# Altium footprint library csy.PcbLib: 198 footprints (part 9 of 13)
Each footprint in its own frame and in the unit in brackets; x right, y up, seen from the top. Pads: shape width x height; smd on the part's side, far side on the other; paste and mask are expansions set on the pad; w line width, h text height; cw(c..) or ccw(c..) is an arc to the next point about the centre after c.
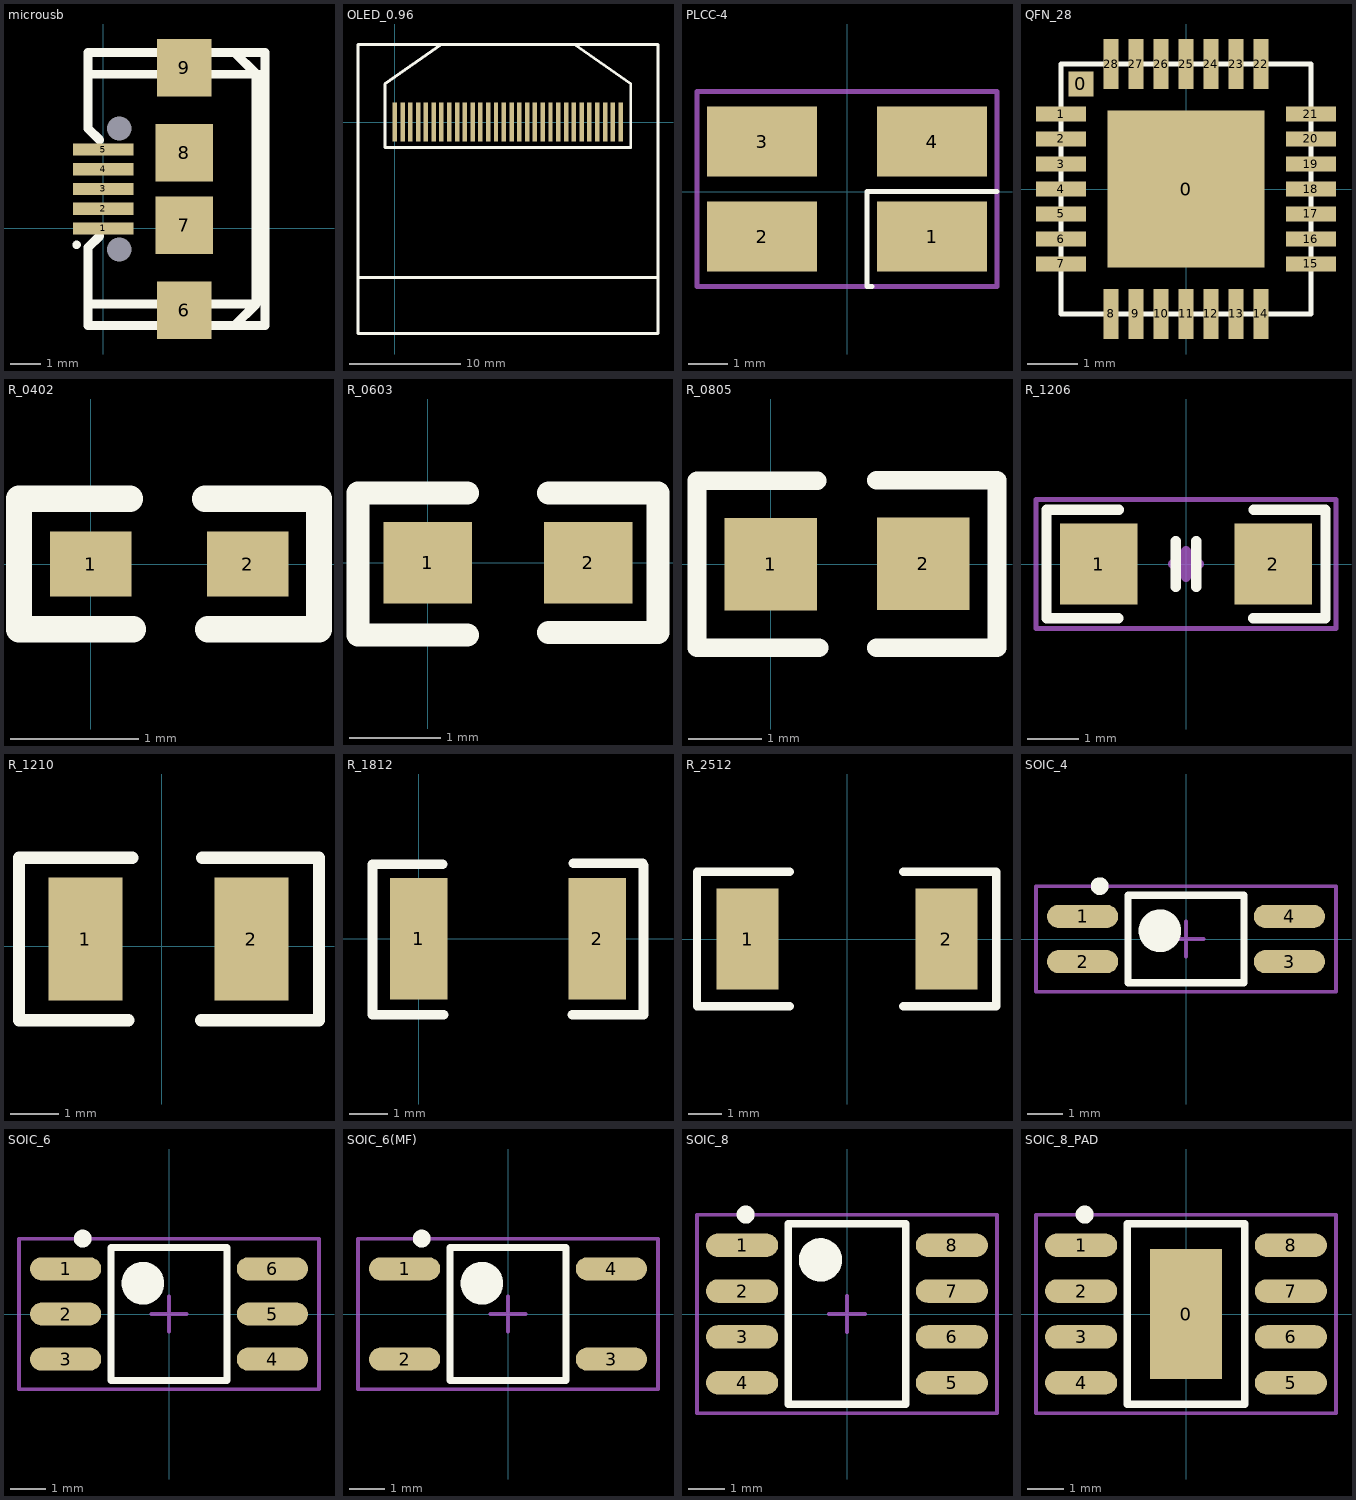
[diagram p8: the footprints below, top view; thin cyan lines are the x and y axes]

## microusb [mm] "Connector; USB1.1, Type B, SM; 4 Position; Right Angle"
height 11
pads (11):
  rect 2x0.4 smd mask+0.001: 1(0,0) 2(0,0.65) 3(0,1.3) 4(0,1.95) 5(0,2.6)
  rect 1.8x1.9 smd: 6(2.675,-2.7) 9(2.675,5.3)
  rect 1.9x1.9 smd: 7(2.675,0.1) 8(2.675,2.5)
  round 0 hole 0.8 unplated mask+0.001: MH1(0.525,3.3) MH2(0.525,-0.7)
Top Overlay:
  circle w0.25: c-0.881,-0.542 r0.011
  lines w0.3: -0.452,-2.495 5.04,-2.495 ; -0.452,5.094 5.334,5.08 5.04,5.094 ; -0.127,-0.254 -0.5,-0.627 -0.5,-3.209 4.326,-3.209 5.04,-2.495 ; -0.127,2.921 -0.5,3.294 -0.5,5.808 4.326,5.808 5.04,5.094 ; 3.818,5.808 5.334,5.808 5.334,-3.209 3.945,-3.209 ; 5.04,-2.495 5.04,5.094
3D body "AP2014.STEP": height 2.79, standoff -0.28, extent -0.11,-3.091 5.515,5.709

## OLED_0.96 [mm] "128*64"
height 0.051
pads (30):
  rect 0.4x3.5 smd: 1(0,0) 2(0.7,0) 3(1.4,0) 4(2.1,0) 5(2.8,0) 6(3.5,0) 7(4.2,0) 8(4.9,0) 9(5.6,0) 10(6.3,0) 11(7,0) 12(7.7,0) 13(8.4,0) 14(9.1,0) 15(9.8,0) 16(10.5,0) 17(11.2,0) 18(11.9,0) 19(12.6,0) 20(13.3,0) 21(14,0) 22(14.7,0) 23(15.4,0) 24(16.1,0) 25(16.8,0) 26(17.5,0) 27(18.2,0) 28(18.9,0) 29(19.6,0) 30(20.3,0)
Top Overlay:
  lines w0.254: -3.302,-13.97 4.572,-13.97 ; 4.191,6.985 -0.889,3.429 -0.889,-2.286 21.209,-2.286 21.209,3.429 16.129,6.985 ; 4.318,-13.97 23.533,-13.97 ; -3.302,-19.015 23.66,-19.015 23.66,6.985 -3.302,6.985 -3.302,-19.015

## PLCC-4 [mil]
pads (4):
  rect 110x70 smd: 1(85,-45) 2(-85,-45) 3(-85,50) 4(85,50)
Top Overlay:
  lines w5: 25,-95 20,-95 20,0 150,0
Mechanical 4:
  lines w5: -150,-95 25,-95 ; -150,-95 -150,100 ; -150,-95 25,-95 ; -150,-95 -150,100 ; -150,100 150,100 ; -150,100 150,100 ; 25,-95 150,-95 ; 25,-95 150,-95 ; 150,-95 150,0 ; 150,-95 150,0 ; 150,0 150,100 ; 150,0 150,100

## QFN_28 [mm] "CP2102_GMR"
pads (30):
  rect 0.5x0.5 smd: 0(-2.1,2.1)
  rect 3.15x3.15 smd: 0(0,0)
  rect 1x0.3 smd: 1(-2.5,1.5) 2(-2.5,1) 3(-2.5,0.5) 4(-2.5,0) 5(-2.5,-0.5) 6(-2.5,-1) 7(-2.5,-1.5) 15(2.5,-1.5) 16(2.5,-1) 17(2.5,-0.5) 18(2.5,0) 19(2.5,0.5) 20(2.5,1) 21(2.5,1.5)
  rect 0.3x1 smd: 8(-1.5,-2.5) 9(-1,-2.5) 10(-0.5,-2.5) 11(0,-2.5) 12(0.5,-2.5) 13(1,-2.5) 14(1.5,-2.5) 22(1.5,2.5) 23(1,2.5) 24(0.5,2.5) 25(0,2.5) 26(-0.5,2.5) 27(-1,2.5) 28(-1.5,2.5)
Top Overlay:
  lines w0.1: -2.5,-2.5 -2.5,2.5 2.5,2.5 2.5,-2.5 -2.5,-2.5
3D body "CP2102-GMR.STEP": height 0.92, standoff 0, extent -2.5,-2.5 2.5,2.5

## R_0402 [mil] "1/16W"
pads (2):
  rect 25x20 smd: 1(0,0) 2(48.2,0)
Top Overlay:
  lines w8: 12,20 -22,20 -22,-20 13,-20 ; 35,20 70,20 70,-20 36,-20
3D body "R0402.STEP": height 13.78, standoff 0, extent 4.71,-9.79 44.09,9.9

## R_0603 [mil] "1608"
pads (2):
  rect 38x35 smd: 1(0,0) 2(69,0)
Top Overlay:
  lines w10: 17,-31 -30,-31 -30,30 17,30 ; 52,-30 99,-30 99,30 52,30
3D body: height 17.72, standoff 0, extent 3.51,-15.74 66.5,15.75

## R_0805 [mm] "2012"
pads (2):
  rect 1.27x1.27 smd: 1(0,0) 2(2.09,0.005)
Top Overlay:
  lines w0.254: 0.635,1.143 -1.011,1.143 -1.011,-1.143 0.66,-1.143 ; 1.448,-1.143 3.099,-1.143 3.099,1.148 1.448,1.148
3D body: height 0.55, standoff 0, extent 0.036,-0.62 2.036,0.64

## R_1206 [mm] "[3216]"
pads (2):
  rect 1.52x1.6 smd: 1(-1.713,0) 2(1.712,0)
Top Overlay:
  lines w0.2: -1.331,-1.067 -2.743,-1.067 -2.743,1.067 -1.323,1.067 ; -0.2,-0.45 -0.2,0.45 ; 0.2,-0.45 0.2,0.45 ; 1.322,-1.067 2.743,-1.067 2.743,1.067 1.331,1.067
Mechanical 15:
  lines w0.1: -2.946,-1.27 -2.946,1.27 2.946,1.27 2.946,-1.27 -2.946,-1.27
  lines w0.2: -0.254,0 0.254,0 ; 0,-0.254 0,0.254
3D body "C_1206.STEP": height 1.21, standoff -0.01, extent -1.6,-0.81 1.6,0.81

## R_1210 [mil] "1/3W"
pads (2):
  rect 60x100 smd: 1(-62,6) 2(73,6)
Top Overlay:
  lines w10: -27,-60 -116,-60 -116,72 -24,72 ; 32,-60 128,-60 128,72 ; 33,72 126.8,72
3D body "1210(3225M) Cap.STEP": height 67.1, standoff 0, extent -72.75,-44 84.75,54

## R_1812 [mil] "4532"
pads (2):
  rect 60x125.98 smd: 1(0,0) 2(185,0)
Top Overlay:
  lines w10: 25,77 -48,77 -48,-78.74 26,-78.74 ; 159,-78.74 233,-78.74 ; 160,78 232,78 ; 233,-78 233,76
3D body "R1808(4520M)1.STEP": height 39.37, standoff 0, extent 2,-39 179.77,37.49

## R_2512 [mil] "6432"
pads (2):
  rect 74x120 smd: 1(-118,0) 2(118,0)
Top Overlay:
  lines w10: -68,-80 -178,-80 -178,80 -68,80 ; 67,-80 177,-80 177,80 67,80
3D body "R2512.STEP": height 39.72, standoff 4.28, extent -125.98,-62.98 125.98,63

## SOIC_4 [mm]
pads (4):
  oval 2x0.65 smd: 1(-2.906,0.635) 2(-2.906,-0.635) 3(2.906,-0.635) 4(2.906,0.635)
Top Overlay:
  circle w0.6: c-0.735,0.23 r0.3
  circle w0.25: c-2.425,1.485 r0.125
  lines w0.2: -1.626,-1.23 1.626,-1.23 1.626,1.23 -1.626,1.23 -1.626,-1.23
Mechanical 15:
  lines w0.1: -0.5,0 0.5,0 ; 0,-0.5 0,0.5 ; -4.216,-1.48 4.216,-1.48 4.216,1.48 -4.216,1.48 -4.216,-1.48
3D body "SOIC_4.STEP": height 1.45, standoff 0, extent -2.981,-1.181 2.981,1.181

## SOIC_6 [mm]
pads (6):
  oval 2x0.65 smd: 1(-2.906,1.27) 2(-2.906,0) 3(-2.906,-1.27) 4(2.906,-1.27) 5(2.906,0) 6(2.906,1.27)
Top Overlay:
  circle w0.6: c-0.735,0.865 r0.3
  circle w0.25: c-2.425,2.12 r0.125
  lines w0.2: -1.626,-1.865 1.626,-1.865 1.626,1.865 -1.626,1.865 -1.626,-1.865
Mechanical 15:
  lines w0.1: -0.5,0 0.5,0 ; 0,-0.5 0,0.5 ; -4.216,-2.115 4.216,-2.115 4.216,2.115 -4.216,2.115 -4.216,-2.115
3D body "SOIC_6.STEP": height 2.78, standoff -0.01, extent -3.199,-1.8 3.199,1.8

## SOIC_6(MF) [mm]
pads (4):
  oval 2x0.65 smd: 1(-2.906,1.27) 2(-2.906,-1.27) 3(2.906,-1.27) 4(2.906,1.27)
Top Overlay:
  circle w0.25: c-2.425,2.12 r0.125
  circle w0.6: c-0.735,0.865 r0.3
  lines w0.2: -1.626,-1.865 -1.626,1.865 1.626,1.865 1.626,-1.865 -1.626,-1.865
Mechanical 15:
  lines w0.1: -0.5,0 0.5,0 ; 0,-0.5 0,0.5 ; -4.216,-2.115 -4.216,2.115 4.216,2.115 4.216,-2.115 -4.216,-2.115
3D body "SOIC_6(MF).STEP": height 2.78, standoff -0.01, extent -3.199,-1.8 3.199,1.8

## SOIC_8 [mm]
height 1.75
pads (8):
  oval 2x0.65 smd: 1(-2.906,1.905) 2(-2.906,0.635) 3(-2.906,-0.635) 4(-2.906,-1.905) 5(2.906,-1.905) 6(2.906,-0.635) 7(2.906,0.635) 8(2.906,1.905)
Top Overlay:
  circle w0.6: c-0.735,1.5 r0.3
  circle w0.25: c-2.806,2.755 r0.125
  lines w0.2: -1.626,-2.5 -1.626,2.5 1.626,2.5 1.626,-2.5 -1.626,-2.5
Mechanical 15:
  lines w0.1: -0.5,0 0.5,0 ; 0,-0.5 0,0.5 ; -4.156,-2.75 4.156,-2.75 4.156,2.75 -4.156,2.75 -4.156,-2.75
3D body "SOIC_8.STEP": height 1.8, standoff 0, extent -2.999,-2.5 2.999,2.5

## SOIC_8_PAD [mm]
height 1.75
pads (9):
  rect 2x3.6 smd: 0(0,0)
  oval 2x0.65 smd: 1(-2.906,1.905) 2(-2.906,0.635) 3(-2.906,-0.635) 4(-2.906,-1.905) 5(2.906,-1.905) 6(2.906,-0.635) 7(2.906,0.635) 8(2.906,1.905)
Top Overlay:
  circle w0.25: c-2.806,2.755 r0.125
  lines w0.2: -1.626,-2.5 -1.626,2.5 1.626,2.5 1.626,-2.5 -1.626,-2.5
Mechanical 15:
  lines w0.1: -0.5,0 0.5,0 ; 0,-0.5 0,0.5 ; -4.156,-2.75 4.156,-2.75 4.156,2.75 -4.156,2.75 -4.156,-2.75
3D body "SOIC_8_PAD.STEP": height 1.8, standoff 0, extent -2.999,-2.5 2.999,2.5